# Altium footprint library Package_DFN_QFN.PcbLib: 557 footprints (part 21 of 35) (continued)
## QFN-64-1EP_9x9mm_P0.5mm_EP7.15x7.15mm [mm]
pads (90):
  rrect25% 0.875x0.25 smd: 1(-4.437,3.75) 2(-4.437,3.25) 3(-4.437,2.75) 4(-4.437,2.25) 5(-4.437,1.75) 6(-4.437,1.25) 7(-4.437,0.75) 8(-4.437,0.25) 9(-4.437,-0.25) 10(-4.437,-0.75) 11(-4.437,-1.25) 12(-4.437,-1.75) 13(-4.437,-2.25) 14(-4.437,-2.75) 15(-4.437,-3.25) 16(-4.437,-3.75) 33(4.437,-3.75) 34(4.437,-3.25) 35(4.437,-2.75) 36(4.437,-2.25) 37(4.437,-1.75) 38(4.437,-1.25) 39(4.437,-0.75) 40(4.437,-0.25) 41(4.437,0.25) 42(4.437,0.75) 43(4.437,1.25) 44(4.437,1.75) 45(4.437,2.25) 46(4.437,2.75) 47(4.437,3.25) 48(4.437,3.75)
  rrect25% 0.25x0.875 smd: 17(-3.75,-4.437) 18(-3.25,-4.437) 19(-2.75,-4.437) 20(-2.25,-4.437) 21(-1.75,-4.437) 22(-1.25,-4.437) 23(-0.75,-4.437) 24(-0.25,-4.437) 25(0.25,-4.437) 26(0.75,-4.437) 27(1.25,-4.437) 28(1.75,-4.437) 29(2.25,-4.437) 30(2.75,-4.437) 31(3.25,-4.437) 32(3.75,-4.437) 49(3.75,4.437) 50(3.25,4.437) 51(2.75,4.437) 52(2.25,4.437) 53(1.75,4.437) 54(1.25,4.437) 55(0.75,4.437) 56(0.25,4.437) 57(-0.25,4.437) 58(-0.75,4.437) 59(-1.25,4.437) 60(-1.75,4.437) 61(-2.25,4.437) 62(-2.75,4.437) 63(-3.25,4.437) 64(-3.75,4.437)
  rect 7.15x7.15 smd: 65(0,0)
  rrect22% 1.15x1.15 on Top Paste: Un1(-1.43,2.86) Un2(-2.86,2.86) Un3(2.86,-2.86) Un4(0,2.86) Un5(2.86,-1.43) Un6(2.86,2.86) Un7(1.43,0) Un8(0,1.43) Un9(-1.43,1.43) Un10(0,0) Un11(1.43,2.86) Un12(-2.86,-1.43) Un13(-1.43,-2.86) Un14(1.43,-2.86) Un15(2.86,1.43) Un16(-2.86,-2.86) Un17(-1.43,-1.43) Un18(0,-1.43) Un19(-1.43,0) Un20(1.43,-1.43) Un21(-2.86,1.43) Un22(1.43,1.43) Un23(2.86,0) Un24(0,-2.86) Un25(-2.86,0)
F.SilkS:
  lines w0.12: -4.61,-4.135 -4.61,-4.61 -4.135,-4.61 ; -4.61,4.61 -4.135,4.61 ; 4.135,-4.61 4.61,-4.61 4.61,-4.135 ; 4.135,4.61 4.61,4.61 4.61,4.135
F.CrtYd:
  lines w0.05: -5.12,-5.12 -5.12,5.12 5.12,5.12 5.12,-5.12 -5.12,-5.12
F.Fab:
  lines w0.1: -4.5,-4.5 -4.5,3.5 -3.5,4.5 4.5,4.5 4.5,-4.5 -4.5,-4.5
  text "'.Designator'" at -4.047,-0.84 h1

## QFN-64-1EP_9x9mm_P0.5mm_EP7.15x7.15mm_ThermalVias [mm]
pads (127):
  rrect25% 0.875x0.25 smd: 1(-4.437,3.75) 2(-4.437,3.25) 3(-4.437,2.75) 4(-4.437,2.25) 5(-4.437,1.75) 6(-4.437,1.25) 7(-4.437,0.75) 8(-4.437,0.25) 9(-4.437,-0.25) 10(-4.437,-0.75) 11(-4.437,-1.25) 12(-4.437,-1.75) 13(-4.437,-2.25) 14(-4.437,-2.75) 15(-4.437,-3.25) 16(-4.437,-3.75) 33(4.437,-3.75) 34(4.437,-3.25) 35(4.437,-2.75) 36(4.437,-2.25) 37(4.437,-1.75) 38(4.437,-1.25) 39(4.437,-0.75) 40(4.437,-0.25) 41(4.437,0.25) 42(4.437,0.75) 43(4.437,1.25) 44(4.437,1.75) 45(4.437,2.25) 46(4.437,2.75) 47(4.437,3.25) 48(4.437,3.75)
  rrect25% 0.25x0.875 smd: 17(-3.75,-4.437) 18(-3.25,-4.437) 19(-2.75,-4.437) 20(-2.25,-4.437) 21(-1.75,-4.437) 22(-1.25,-4.437) 23(-0.75,-4.437) 24(-0.25,-4.437) 25(0.25,-4.437) 26(0.75,-4.437) 27(1.25,-4.437) 28(1.75,-4.437) 29(2.25,-4.437) 30(2.75,-4.437) 31(3.25,-4.437) 32(3.75,-4.437) 49(3.75,4.437) 50(3.25,4.437) 51(2.75,4.437) 52(2.25,4.437) 53(1.75,4.437) 54(1.25,4.437) 55(0.75,4.437) 56(0.25,4.437) 57(-0.25,4.437) 58(-0.75,4.437) 59(-1.25,4.437) 60(-1.75,4.437) 61(-2.25,4.437) 62(-2.75,4.437) 63(-3.25,4.437) 64(-3.75,4.437)
  round 0.5 hole 0.2: 65(-3.325,-3.325) 65(-3.325,-1.995) 65(-3.325,-0.665) 65(-3.325,0.665) 65(-3.325,1.995) 65(-3.325,3.325) 65(-1.995,-3.325) 65(-1.995,-1.995) 65(-1.995,-0.665) 65(-1.995,0.665) 65(-1.995,1.995) 65(-1.995,3.325) 65(-0.665,-3.325) 65(-0.665,-1.995) 65(-0.665,-0.665) 65(-0.665,0.665) 65(-0.665,1.995) 65(-0.665,3.325) 65(0.665,-3.325) 65(0.665,-1.995) 65(0.665,-0.665) 65(0.665,0.665) 65(0.665,1.995) 65(0.665,3.325) 65(1.995,-3.325) 65(1.995,-1.995) 65(1.995,-0.665) 65(1.995,0.665) 65(1.995,1.995) 65(1.995,3.325) 65(3.325,-3.325) 65(3.325,-1.995) 65(3.325,-0.665) 65(3.325,0.665) 65(3.325,1.995) 65(3.325,3.325)
  rect 7.15x7.15 smd: 65(0,0)
  rect 7.15x7.15 smd far side: 65(0,0)
  rrect22% 1.153x1.153 on Top Paste: Un1(-2.66,0) Un2(2.66,0) Un3(-1.33,-1.33) Un4(2.66,-2.66) Un5(-2.66,2.66) Un6(1.33,2.66) Un7(-1.33,1.33) Un8(-1.33,2.66) Un9(1.33,-2.66) Un10(1.33,0) Un11(2.66,1.33) Un12(0,1.33) Un13(2.66,-1.33) Un14(-2.66,-1.33) Un15(-1.33,-2.66) Un16(-2.66,-2.66) Un17(0,-2.66) Un18(2.66,2.66) Un19(1.33,1.33) Un20(0,2.66) Un21(0,-1.33) Un22(0,0) Un23(-2.66,1.33) Un24(1.33,-1.33) Un25(-1.33,0)
F.SilkS:
  lines w0.12: -4.61,-4.135 -4.61,-4.61 -4.135,-4.61 ; -4.61,4.61 -4.135,4.61 ; 4.135,-4.61 4.61,-4.61 4.61,-4.135 ; 4.135,4.61 4.61,4.61 4.61,4.135
F.CrtYd:
  lines w0.05: -5.12,-5.12 -5.12,5.12 5.12,5.12 5.12,-5.12 -5.12,-5.12
F.Fab:
  lines w0.1: -4.5,-4.5 4.5,-4.5 4.5,4.5 -3.5,4.5 -4.5,3.5 -4.5,-4.5
  text "'.Designator'" at -4.047,-0.84 h1

## QFN-64-1EP_9x9mm_P0.5mm_EP7.25x7.25mm [mm]
pads (90):
  rrect100% 0.8x0.3 smd: 1(-4.5,3.75) 2(-4.5,3.25) 3(-4.5,2.75) 4(-4.5,2.25) 5(-4.5,1.75) 6(-4.5,1.25) 7(-4.5,0.75) 8(-4.5,0.25) 9(-4.5,-0.25) 10(-4.5,-0.75) 11(-4.5,-1.25) 12(-4.5,-1.75) 13(-4.5,-2.25) 14(-4.5,-2.75) 15(-4.5,-3.25) 16(-4.5,-3.75) 33(4.5,-3.75) 34(4.5,-3.25) 35(4.5,-2.75) 36(4.5,-2.25) 37(4.5,-1.75) 38(4.5,-1.25) 39(4.5,-0.75) 40(4.5,-0.25) 41(4.5,0.25) 42(4.5,0.75) 43(4.5,1.25) 44(4.5,1.75) 45(4.5,2.25) 46(4.5,2.75) 47(4.5,3.25) 48(4.5,3.75)
  rrect100% 0.3x0.8 smd: 17(-3.75,-4.5) 18(-3.25,-4.5) 19(-2.75,-4.5) 20(-2.25,-4.5) 21(-1.75,-4.5) 22(-1.25,-4.5) 23(-0.75,-4.5) 24(-0.25,-4.5) 25(0.25,-4.5) 26(0.75,-4.5) 27(1.25,-4.5) 28(1.75,-4.5) 29(2.25,-4.5) 30(2.75,-4.5) 31(3.25,-4.5) 32(3.75,-4.5) 49(3.75,4.5) 50(3.25,4.5) 51(2.75,4.5) 52(2.25,4.5) 53(1.75,4.5) 54(1.25,4.5) 55(0.75,4.5) 56(0.25,4.5) 57(-0.25,4.5) 58(-0.75,4.5) 59(-1.25,4.5) 60(-1.75,4.5) 61(-2.25,4.5) 62(-2.75,4.5) 63(-3.25,4.5) 64(-3.75,4.5)
  rect 7.25x7.25 smd: 65(0,0)
  rect 1.19x1.19 on Top Paste: Un1(1.4,-2.8) Un2(0,2.8) Un3(2.8,1.4) Un4(0,1.4) Un5(-2.8,-2.8) Un6(-1.4,0) Un7(0,-1.4) Un8(-2.8,0) Un9(2.8,0) Un10(0,-2.8) Un11(2.8,2.8) Un12(0,0) Un13(-1.4,2.8) Un14(-1.4,-1.4) Un15(1.4,0) Un16(1.4,2.8) Un17(-2.8,1.4) Un18(2.8,-1.4) Un19(-1.4,1.4) Un20(2.8,-2.8) Un21(-2.8,2.8) Un22(-1.4,-2.8) Un23(-2.8,-1.4) Un24(1.4,-1.4) Un25(1.4,1.4)
F.SilkS:
  lines w0.12: -4.62,-4.2 -4.62,-4.62 -4.2,-4.62 ; -4.62,4.62 -4.2,4.62 ; 4.2,-4.62 4.62,-4.62 4.62,-4.2 ; 4.2,4.62 4.62,4.62 4.62,4.2
F.CrtYd:
  lines w0.05: -5.15,-5.15 5.15,-5.15 5.15,5.15 -5.15,5.15 -5.15,-5.15
F.Fab:
  lines w0.1: -4.5,-4.5 -4.5,3.5 -3.5,4.5 4.5,4.5 4.5,-4.5 -4.5,-4.5
  text "'.Designator'" at -4.047,-0.84 h1

## QFN-64-1EP_9x9mm_P0.5mm_EP7.35x7.35mm [mm]
pads (90):
  rect 0.85x0.3 smd: 1(-4.45,3.75) 2(-4.45,3.25) 3(-4.45,2.75) 4(-4.45,2.25) 5(-4.45,1.75) 6(-4.45,1.25) 7(-4.45,0.75) 8(-4.45,0.25) 9(-4.45,-0.25) 10(-4.45,-0.75) 11(-4.45,-1.25) 12(-4.45,-1.75) 13(-4.45,-2.25) 14(-4.45,-2.75) 15(-4.45,-3.25) 16(-4.45,-3.75) 33(4.45,-3.75) 34(4.45,-3.25) 35(4.45,-2.75) 36(4.45,-2.25) 37(4.45,-1.75) 38(4.45,-1.25) 39(4.45,-0.75) 40(4.45,-0.25) 41(4.45,0.25) 42(4.45,0.75) 43(4.45,1.25) 44(4.45,1.75) 45(4.45,2.25) 46(4.45,2.75) 47(4.45,3.25) 48(4.45,3.75)
  rect 0.3x0.85 smd: 17(-3.75,-4.45) 18(-3.25,-4.45) 19(-2.75,-4.45) 20(-2.25,-4.45) 21(-1.75,-4.45) 22(-1.25,-4.45) 23(-0.75,-4.45) 24(-0.25,-4.45) 25(0.25,-4.45) 26(0.75,-4.45) 27(1.25,-4.45) 28(1.75,-4.45) 29(2.25,-4.45) 30(2.75,-4.45) 31(3.25,-4.45) 32(3.75,-4.45) 49(3.75,4.45) 50(3.25,4.45) 51(2.75,4.45) 52(2.25,4.45) 53(1.75,4.45) 54(1.25,4.45) 55(0.75,4.45) 56(0.25,4.45) 57(-0.25,4.45) 58(-0.75,4.45) 59(-1.25,4.45) 60(-1.75,4.45) 61(-2.25,4.45) 62(-2.75,4.45) 63(-3.25,4.45) 64(-3.75,4.45)
  rect 7.35x7.35 smd: 65(0,0)
  rect 1.19x1.19 on Top Paste: Un1(-1.47,-2.94) Un2(-2.94,1.47) Un3(1.47,2.94) Un4(-2.94,0) Un5(1.47,0) Un6(1.47,-2.94) Un7(2.94,-1.47) Un8(-1.47,0) Un9(-1.47,2.94) Un10(2.94,0) Un11(0,2.94) Un12(-1.47,-1.47) Un13(2.94,1.47) Un14(0,-1.47) Un15(-2.94,-1.47) Un16(1.47,1.47) Un17(2.94,-2.94) Un18(-2.94,-2.94) Un19(2.94,2.94) Un20(0,1.47) Un21(1.47,-1.47) Un22(0,-2.94) Un23(0,0) Un24(-1.47,1.47) Un25(-2.94,2.94)
F.SilkS:
  lines w0.15: -4.7,-4.125 -4.7,-4.7 -4.125,-4.7 ; -4.7,4.7 -4.125,4.7 ; 4.125,-4.7 4.7,-4.7 4.7,-4.125 ; 4.125,4.7 4.7,4.7 4.7,4.125
F.CrtYd:
  lines w0.05: -5.15,-5.15 -5.15,5.15 5.15,5.15 5.15,-5.15 -5.15,-5.15
F.Fab:
  lines w0.15: -4.5,-4.5 -4.5,3.5 -3.5,4.5 4.5,4.5 4.5,-4.5 -4.5,-4.5
  text "'.Designator'" at -4.047,-0.84 h1

## QFN-64-1EP_9x9mm_P0.5mm_EP7.65x7.65mm [mm]
pads (101):
  rrect25% 0.85x0.25 smd: 1(-4.45,3.75) 2(-4.45,3.25) 3(-4.45,2.75) 4(-4.45,2.25) 5(-4.45,1.75) 6(-4.45,1.25) 7(-4.45,0.75) 8(-4.45,0.25) 9(-4.45,-0.25) 10(-4.45,-0.75) 11(-4.45,-1.25) 12(-4.45,-1.75) 13(-4.45,-2.25) 14(-4.45,-2.75) 15(-4.45,-3.25) 16(-4.45,-3.75) 33(4.45,-3.75) 34(4.45,-3.25) 35(4.45,-2.75) 36(4.45,-2.25) 37(4.45,-1.75) 38(4.45,-1.25) 39(4.45,-0.75) 40(4.45,-0.25) 41(4.45,0.25) 42(4.45,0.75) 43(4.45,1.25) 44(4.45,1.75) 45(4.45,2.25) 46(4.45,2.75) 47(4.45,3.25) 48(4.45,3.75)
  rrect25% 0.25x0.85 smd: 17(-3.75,-4.45) 18(-3.25,-4.45) 19(-2.75,-4.45) 20(-2.25,-4.45) 21(-1.75,-4.45) 22(-1.25,-4.45) 23(-0.75,-4.45) 24(-0.25,-4.45) 25(0.25,-4.45) 26(0.75,-4.45) 27(1.25,-4.45) 28(1.75,-4.45) 29(2.25,-4.45) 30(2.75,-4.45) 31(3.25,-4.45) 32(3.75,-4.45) 49(3.75,4.45) 50(3.25,4.45) 51(2.75,4.45) 52(2.25,4.45) 53(1.75,4.45) 54(1.25,4.45) 55(0.75,4.45) 56(0.25,4.45) 57(-0.25,4.45) 58(-0.75,4.45) 59(-1.25,4.45) 60(-1.75,4.45) 61(-2.25,4.45) 62(-2.75,4.45) 63(-3.25,4.45) 64(-3.75,4.45)
  rect 7.65x7.65 smd: 65(0,0)
  rrect24% 1.03x1.03 on Top Paste: Un1(-3.2,-1.92) Un2(-0.64,-0.64) Un3(3.2,-3.2) Un4(-0.64,-1.92) Un5(1.92,-3.2) Un6(3.2,0.64) Un7(1.92,-0.64) Un8(-1.92,-0.64) Un9(1.92,-1.92) Un10(1.92,0.64) Un11(0.64,1.92) Un12(-0.64,-3.2) Un13(1.92,3.2) Un14(3.2,-0.64) Un15(1.92,1.92) Un16(0.64,-1.92) Un17(3.2,3.2) Un18(0.64,0.64) Un19(3.2,-1.92) Un20(-3.2,1.92) Un21(-1.92,1.92) Un22(-3.2,0.64) Un23(-1.92,0.64) Un24(-0.64,0.64) Un25(-1.92,-3.2) Un26(0.64,-0.64) Un27(-3.2,-0.64) Un28(-1.92,-1.92) Un29(-3.2,3.2) Un30(-0.64,3.2) Un31(-3.2,-3.2) Un32(3.2,1.92) Un33(0.64,-3.2) Un34(0.64,3.2) Un35(-1.92,3.2) Un36(-0.64,1.92)
F.SilkS:
  lines w0.12: -4.61,-4.135 -4.61,-4.61 -4.135,-4.61 ; -4.61,4.61 -4.135,4.61 ; 4.135,-4.61 4.61,-4.61 4.61,-4.135 ; 4.135,4.61 4.61,4.61 4.61,4.135
F.CrtYd:
  lines w0.05: -5.12,-5.12 -5.12,5.12 5.12,5.12 5.12,-5.12 -5.12,-5.12
F.Fab:
  lines w0.1: -4.5,-4.5 4.5,-4.5 4.5,4.5 -3.5,4.5 -4.5,3.5 -4.5,-4.5
  text "'.Designator'" at -4.047,-0.84 h1

## QFN-64-1EP_9x9mm_P0.5mm_EP7.65x7.65mm_ThermalVias [mm]
pads (151):
  rrect25% 0.85x0.25 smd: 1(-4.45,3.75) 2(-4.45,3.25) 3(-4.45,2.75) 4(-4.45,2.25) 5(-4.45,1.75) 6(-4.45,1.25) 7(-4.45,0.75) 8(-4.45,0.25) 9(-4.45,-0.25) 10(-4.45,-0.75) 11(-4.45,-1.25) 12(-4.45,-1.75) 13(-4.45,-2.25) 14(-4.45,-2.75) 15(-4.45,-3.25) 16(-4.45,-3.75) 33(4.45,-3.75) 34(4.45,-3.25) 35(4.45,-2.75) 36(4.45,-2.25) 37(4.45,-1.75) 38(4.45,-1.25) 39(4.45,-0.75) 40(4.45,-0.25) 41(4.45,0.25) 42(4.45,0.75) 43(4.45,1.25) 44(4.45,1.75) 45(4.45,2.25) 46(4.45,2.75) 47(4.45,3.25) 48(4.45,3.75)
  rrect25% 0.25x0.85 smd: 17(-3.75,-4.45) 18(-3.25,-4.45) 19(-2.75,-4.45) 20(-2.25,-4.45) 21(-1.75,-4.45) 22(-1.25,-4.45) 23(-0.75,-4.45) 24(-0.25,-4.45) 25(0.25,-4.45) 26(0.75,-4.45) 27(1.25,-4.45) 28(1.75,-4.45) 29(2.25,-4.45) 30(2.75,-4.45) 31(3.25,-4.45) 32(3.75,-4.45) 49(3.75,4.45) 50(3.25,4.45) 51(2.75,4.45) 52(2.25,4.45) 53(1.75,4.45) 54(1.25,4.45) 55(0.75,4.45) 56(0.25,4.45) 57(-0.25,4.45) 58(-0.75,4.45) 59(-1.25,4.45) 60(-1.75,4.45) 61(-2.25,4.45) 62(-2.75,4.45) 63(-3.25,4.45) 64(-3.75,4.45)
  round 0.5 hole 0.2: 65(-3.575,-3.575) 65(-3.575,-2.383) 65(-3.575,-1.192) 65(-3.575,0) 65(-3.575,1.192) 65(-3.575,2.383) 65(-3.575,3.575) 65(-2.383,-3.575) 65(-2.383,-2.383) 65(-2.383,-1.192) 65(-2.383,0) 65(-2.383,1.192) 65(-2.383,2.383) 65(-2.383,3.575) 65(-1.192,-3.575) 65(-1.192,-2.383) 65(-1.192,-1.192) 65(-1.192,0) 65(-1.192,1.192) 65(-1.192,2.383) 65(-1.192,3.575) 65(0,-3.575) 65(0,-2.383) 65(0,-1.192) 65(0,0) 65(0,1.192) 65(0,2.383) 65(0,3.575) 65(1.192,-3.575) 65(1.192,-2.383) 65(1.192,-1.192) 65(1.192,0) 65(1.192,1.192) 65(1.192,2.383) 65(1.192,3.575) 65(2.383,-3.575) 65(2.383,-2.383) 65(2.383,-1.192) 65(2.383,0) 65(2.383,1.192) 65(2.383,2.383) 65(2.383,3.575) 65(3.575,-3.575) 65(3.575,-2.383) 65(3.575,-1.192) 65(3.575,0) 65(3.575,1.192) 65(3.575,2.383) 65(3.575,3.575)
  rect 7.65x7.65 smd far side: 65(0,0)
  rect 7.65x7.65 smd: 65(0,0)
  rrect24% 1.028x1.028 on Top Paste: Un1(1.787,2.979) Un2(0.596,-1.787) Un3(0.596,-2.979) Un4(-0.596,2.979) Un5(1.787,-2.979) Un6(0.596,1.787) Un7(-1.787,-2.979) Un8(-1.787,-1.787) Un9(2.979,-1.787) Un10(-0.596,-2.979) Un11(1.787,1.787) Un12(-0.596,0.596) Un13(2.979,1.787) Un14(2.979,-2.979) Un15(-2.979,2.979) Un16(0.596,2.979) Un17(1.787,0.596) Un18(-1.787,2.979) Un19(2.979,2.979) Un20(0.596,-0.596) Un21(-1.787,-0.596) Un22(-2.979,-2.979) Un23(1.787,-0.596) Un24(-0.596,-0.596) Un25(2.979,-0.596) Un26(-1.787,1.787) Un27(-2.979,-0.596) Un28(0.596,0.596) Un29(2.979,0.596) Un30(-1.787,0.596) Un31(1.787,-1.787) Un32(-2.979,1.787) Un33(-0.596,-1.787) Un34(-0.596,1.787) Un35(-2.979,-1.787) Un36(-2.979,0.596)
F.SilkS:
  lines w0.12: -4.61,-4.135 -4.61,-4.61 -4.135,-4.61 ; -4.61,4.61 -4.135,4.61 ; 4.135,-4.61 4.61,-4.61 4.61,-4.135 ; 4.135,4.61 4.61,4.61 4.61,4.135
F.CrtYd:
  lines w0.05: -5.12,-5.12 -5.12,5.12 5.12,5.12 5.12,-5.12 -5.12,-5.12
F.Fab:
  lines w0.1: -4.5,-4.5 4.5,-4.5 4.5,4.5 -3.5,4.5 -4.5,3.5 -4.5,-4.5
  text "'.Designator'" at -4.047,-0.84 h1

## QFN-68-1EP_8x8mm_P0.4mm_EP5.2x5.2mm [mm]
pads (85):
  rrect25% 0.825x0.2 smd: 1(-3.938,3.2) 2(-3.938,2.8) 3(-3.938,2.4) 4(-3.938,2) 5(-3.938,1.6) 6(-3.938,1.2) 7(-3.938,0.8) 8(-3.938,0.4) 9(-3.938,0) 10(-3.938,-0.4) 11(-3.938,-0.8) 12(-3.938,-1.2) 13(-3.938,-1.6) 14(-3.938,-2) 15(-3.938,-2.4) 16(-3.938,-2.8) 17(-3.938,-3.2) 35(3.938,-3.2) 36(3.938,-2.8) 37(3.938,-2.4) 38(3.938,-2) 39(3.938,-1.6) 40(3.938,-1.2) 41(3.938,-0.8) 42(3.938,-0.4) 43(3.938,0) 44(3.938,0.4) 45(3.938,0.8) 46(3.938,1.2) 47(3.938,1.6) 48(3.938,2) 49(3.938,2.4) 50(3.938,2.8) 51(3.938,3.2)
  rrect25% 0.2x0.825 smd: 18(-3.2,-3.938) 19(-2.8,-3.938) 20(-2.4,-3.938) 21(-2,-3.938) 22(-1.6,-3.938) 23(-1.2,-3.938) 24(-0.8,-3.938) 25(-0.4,-3.938) 26(0,-3.938) 27(0.4,-3.938) 28(0.8,-3.938) 29(1.2,-3.938) 30(1.6,-3.938) 31(2,-3.938) 32(2.4,-3.938) 33(2.8,-3.938) 34(3.2,-3.938) 52(3.2,3.938) 53(2.8,3.938) 54(2.4,3.938) 55(2,3.938) 56(1.6,3.938) 57(1.2,3.938) 58(0.8,3.938) 59(0.4,3.938) 60(0,3.938) 61(-0.4,3.938) 62(-0.8,3.938) 63(-1.2,3.938) 64(-1.6,3.938) 65(-2,3.938) 66(-2.4,3.938) 67(-2.8,3.938) 68(-3.2,3.938)
  rect 5.2x5.2 smd: 69(0,0)
  rrect24% 1.05x1.05 on Top Paste: Un1(1.95,-0.65) Un2(1.95,-1.95) Un3(-0.65,0.65) Un4(-1.95,-1.95) Un5(-1.95,0.65) Un6(-1.95,-0.65) Un7(-0.65,-0.65) Un8(0.65,-1.95) Un9(0.65,1.95) Un10(-0.65,-1.95) Un11(0.65,0.65) Un12(1.95,0.65) Un13(-1.95,1.95) Un14(-0.65,1.95) Un15(0.65,-0.65) Un16(1.95,1.95)
F.SilkS:
  lines w0.12: -4.11,-3.56 -4.11,-4.11 -3.56,-4.11 ; -4.11,4.11 -3.56,4.11 ; 3.56,-4.11 4.11,-4.11 4.11,-3.56 ; 3.56,4.11 4.11,4.11 4.11,3.56
F.CrtYd:
  lines w0.05: -4.6,-4.6 4.6,-4.6 4.6,4.6 -4.6,4.6 -4.6,-4.6
F.Fab:
  lines w0.1: -4,-4 -4,3 -3,4 4,4 4,-4 -4,-4
  text "'.Designator'" at -4.047,-0.84 h1

## QFN-68-1EP_8x8mm_P0.4mm_EP5.2x5.2mm_ThermalVias [mm]
pads (111):
  rrect25% 0.825x0.2 smd: 1(-3.938,3.2) 2(-3.938,2.8) 3(-3.938,2.4) 4(-3.938,2) 5(-3.938,1.6) 6(-3.938,1.2) 7(-3.938,0.8) 8(-3.938,0.4) 9(-3.938,0) 10(-3.938,-0.4) 11(-3.938,-0.8) 12(-3.938,-1.2) 13(-3.938,-1.6) 14(-3.938,-2) 15(-3.938,-2.4) 16(-3.938,-2.8) 17(-3.938,-3.2) 35(3.938,-3.2) 36(3.938,-2.8) 37(3.938,-2.4) 38(3.938,-2) 39(3.938,-1.6) 40(3.938,-1.2) 41(3.938,-0.8) 42(3.938,-0.4) 43(3.938,0) 44(3.938,0.4) 45(3.938,0.8) 46(3.938,1.2) 47(3.938,1.6) 48(3.938,2) 49(3.938,2.4) 50(3.938,2.8) 51(3.938,3.2)
  rrect25% 0.2x0.825 smd: 18(-3.2,-3.938) 19(-2.8,-3.938) 20(-2.4,-3.938) 21(-2,-3.938) 22(-1.6,-3.938) 23(-1.2,-3.938) 24(-0.8,-3.938) 25(-0.4,-3.938) 26(0,-3.938) 27(0.4,-3.938) 28(0.8,-3.938) 29(1.2,-3.938) 30(1.6,-3.938) 31(2,-3.938) 32(2.4,-3.938) 33(2.8,-3.938) 34(3.2,-3.938) 52(3.2,3.938) 53(2.8,3.938) 54(2.4,3.938) 55(2,3.938) 56(1.6,3.938) 57(1.2,3.938) 58(0.8,3.938) 59(0.4,3.938) 60(0,3.938) 61(-0.4,3.938) 62(-0.8,3.938) 63(-1.2,3.938) 64(-1.6,3.938) 65(-2,3.938) 66(-2.4,3.938) 67(-2.8,3.938) 68(-3.2,3.938)
  round 0.5 hole 0.2: 69(-2.35,-2.35) 69(-2.35,-1.175) 69(-2.35,0) 69(-2.35,1.175) 69(-2.35,2.35) 69(-1.175,-2.35) 69(-1.175,-1.175) 69(-1.175,0) 69(-1.175,1.175) 69(-1.175,2.35) 69(0,-2.35) 69(0,-1.175) 69(0,0) 69(0,1.175) 69(0,2.35) 69(1.175,-2.35) 69(1.175,-1.175) 69(1.175,0) 69(1.175,1.175) 69(1.175,2.35) 69(2.35,-2.35) 69(2.35,-1.175) 69(2.35,0) 69(2.35,1.175) 69(2.35,2.35)
  rect 5.2x5.2 smd: 69(0,0)
  rect 5.2x5.2 smd far side: 69(0,0)
  rrect25% 1.007x1.007 on Top Paste: Un1(0.587,0.587) Un2(1.763,-1.763) Un3(-0.587,-1.763) Un4(1.763,-0.587) Un5(-1.763,-1.763) Un6(0.587,-0.587) Un7(-0.587,1.763) Un8(-1.763,0.587) Un9(1.763,1.763) Un10(1.763,0.587) Un11(0.587,1.763) Un12(-1.763,-0.587) Un13(0.587,-1.763) Un14(-0.587,0.587) Un15(-0.587,-0.587) Un16(-1.763,1.763)
F.SilkS:
  lines w0.12: -4.11,-3.56 -4.11,-4.11 -3.56,-4.11 ; -4.11,4.11 -3.56,4.11 ; 3.56,-4.11 4.11,-4.11 4.11,-3.56 ; 3.56,4.11 4.11,4.11 4.11,3.56
F.CrtYd:
  lines w0.05: -4.6,-4.6 4.6,-4.6 4.6,4.6 -4.6,4.6 -4.6,-4.6
F.Fab:
  lines w0.1: -4,-4 4,-4 4,4 -3,4 -4,3 -4,-4
  text "'.Designator'" at -4.047,-0.84 h1

## QFN-68-1EP_8x8mm_P0.4mm_EP6.4x6.4mm [mm]
pads (85):
  rrect25% 0.925x0.25 smd: 1(-3.888,3.2) 2(-3.888,2.8) 3(-3.888,2.4) 4(-3.888,2) 5(-3.888,1.6) 6(-3.888,1.2) 7(-3.888,0.8) 8(-3.888,0.4) 9(-3.888,0) 10(-3.888,-0.4) 11(-3.888,-0.8) 12(-3.888,-1.2) 13(-3.888,-1.6) 14(-3.888,-2) 15(-3.888,-2.4) 16(-3.888,-2.8) 17(-3.888,-3.2) 35(3.888,-3.2) 36(3.888,-2.8) 37(3.888,-2.4) 38(3.888,-2) 39(3.888,-1.6) 40(3.888,-1.2) 41(3.888,-0.8) 42(3.888,-0.4) 43(3.888,0) 44(3.888,0.4) 45(3.888,0.8) 46(3.888,1.2) 47(3.888,1.6) 48(3.888,2) 49(3.888,2.4) 50(3.888,2.8) 51(3.888,3.2)
  rrect25% 0.25x0.925 smd: 18(-3.2,-3.888) 19(-2.8,-3.888) 20(-2.4,-3.888) 21(-2,-3.888) 22(-1.6,-3.888) 23(-1.2,-3.888) 24(-0.8,-3.888) 25(-0.4,-3.888) 26(0,-3.888) 27(0.4,-3.888) 28(0.8,-3.888) 29(1.2,-3.888) 30(1.6,-3.888) 31(2,-3.888) 32(2.4,-3.888) 33(2.8,-3.888) 34(3.2,-3.888) 52(3.2,3.888) 53(2.8,3.888) 54(2.4,3.888) 55(2,3.888) 56(1.6,3.888) 57(1.2,3.888) 58(0.8,3.888) 59(0.4,3.888) 60(0,3.888) 61(-0.4,3.888) 62(-0.8,3.888) 63(-1.2,3.888) 64(-1.6,3.888) 65(-2,3.888) 66(-2.4,3.888) 67(-2.8,3.888) 68(-3.2,3.888)
  rect 6.4x6.4 smd: 69(0,0)
  rrect19% 1.29x1.29 on Top Paste: Un1(-2.4,2.4) Un2(-2.4,0.8) Un3(-2.4,-0.8) Un4(-2.4,-2.4) Un5(-0.8,2.4) Un6(-0.8,0.8) Un7(-0.8,-0.8) Un8(-0.8,-2.4) Un9(0.8,2.4) Un10(0.8,0.8) Un11(0.8,-0.8) Un12(0.8,-2.4) Un13(2.4,2.4) Un14(2.4,0.8) Un15(2.4,-0.8) Un16(2.4,-2.4)
F.SilkS:
  lines w0.12: -4.11,-3.585 -4.11,-4.11 -3.585,-4.11 ; -4.11,4.11 -3.585,4.11 ; 3.585,-4.11 4.11,-4.11 4.11,-3.585 ; 3.585,4.11 4.11,4.11 4.11,3.585
F.CrtYd:
  lines w0.05: -4.6,-4.6 -4.6,4.6 4.6,4.6 4.6,-4.6 -4.6,-4.6
F.Fab:
  lines w0.1: -4,-4 4,-4 4,4 -3,4 -4,3 -4,-4
  text "'.Designator'" at -4.047,-0.84 h1

## QFN-68-1EP_8x8mm_P0.4mm_EP6.4x6.4mm_ThermalVias [mm]
pads (111):
  rrect25% 0.925x0.25 smd: 1(-3.888,3.2) 2(-3.888,2.8) 3(-3.888,2.4) 4(-3.888,2) 5(-3.888,1.6) 6(-3.888,1.2) 7(-3.888,0.8) 8(-3.888,0.4) 9(-3.888,0) 10(-3.888,-0.4) 11(-3.888,-0.8) 12(-3.888,-1.2) 13(-3.888,-1.6) 14(-3.888,-2) 15(-3.888,-2.4) 16(-3.888,-2.8) 17(-3.888,-3.2) 35(3.888,-3.2) 36(3.888,-2.8) 37(3.888,-2.4) 38(3.888,-2) 39(3.888,-1.6) 40(3.888,-1.2) 41(3.888,-0.8) 42(3.888,-0.4) 43(3.888,0) 44(3.888,0.4) 45(3.888,0.8) 46(3.888,1.2) 47(3.888,1.6) 48(3.888,2) 49(3.888,2.4) 50(3.888,2.8) 51(3.888,3.2)
  rrect25% 0.25x0.925 smd: 18(-3.2,-3.888) 19(-2.8,-3.888) 20(-2.4,-3.888) 21(-2,-3.888) 22(-1.6,-3.888) 23(-1.2,-3.888) 24(-0.8,-3.888) 25(-0.4,-3.888) 26(0,-3.888) 27(0.4,-3.888) 28(0.8,-3.888) 29(1.2,-3.888) 30(1.6,-3.888) 31(2,-3.888) 32(2.4,-3.888) 33(2.8,-3.888) 34(3.2,-3.888) 52(3.2,3.888) 53(2.8,3.888) 54(2.4,3.888) 55(2,3.888) 56(1.6,3.888) 57(1.2,3.888) 58(0.8,3.888) 59(0.4,3.888) 60(0,3.888) 61(-0.4,3.888) 62(-0.8,3.888) 63(-1.2,3.888) 64(-1.6,3.888) 65(-2,3.888) 66(-2.4,3.888) 67(-2.8,3.888) 68(-3.2,3.888)
  round 0.5 hole 0.2: 69(-2.95,-2.95) 69(-2.95,-1.475) 69(-2.95,0) 69(-2.95,1.475) 69(-2.95,2.95) 69(-1.475,-2.95) 69(-1.475,-1.475) 69(-1.475,0) 69(-1.475,1.475) 69(-1.475,2.95) 69(0,-2.95) 69(0,-1.475) 69(0,0) 69(0,1.475) 69(0,2.95) 69(1.475,-2.95) 69(1.475,-1.475) 69(1.475,0) 69(1.475,1.475) 69(1.475,2.95) 69(2.95,-2.95) 69(2.95,-1.475) 69(2.95,0) 69(2.95,1.475) 69(2.95,2.95)
  rect 6.4x6.4 smd: 69(0,0)
  rect 6.4x6.4 smd far side: 69(0,0)
  rrect20% 1.239x1.239 on Top Paste: Un1(-2.213,2.213) Un2(-2.213,0.737) Un3(-2.213,-0.737) Un4(-2.213,-2.213) Un5(-0.737,2.213) Un6(-0.737,0.737) Un7(-0.737,-0.737) Un8(-0.737,-2.213) Un9(0.737,2.213) Un10(0.737,0.737) Un11(0.737,-0.737) Un12(0.737,-2.213) Un13(2.213,2.213) Un14(2.213,0.737) Un15(2.213,-0.737) Un16(2.213,-2.213)
F.SilkS:
  lines w0.12: -4.11,-3.585 -4.11,-4.11 -3.585,-4.11 ; -4.11,4.11 -3.585,4.11 ; 3.585,-4.11 4.11,-4.11 4.11,-3.585 ; 3.585,4.11 4.11,4.11 4.11,3.585
F.CrtYd:
  lines w0.05: -4.6,-4.6 -4.6,4.6 4.6,4.6 4.6,-4.6 -4.6,-4.6
F.Fab:
  lines w0.1: -4,-4 4,-4 4,4 -3,4 -4,3 -4,-4
  text "'.Designator'" at -4.047,-0.84 h1

## QFN-72-1EP_10x10mm_P0.5mm_EP6x6mm [mm]
pads (82):
  rrect25% 0.875x0.25 smd: 1(-4.938,4.25) 2(-4.938,3.75) 3(-4.938,3.25) 4(-4.938,2.75) 5(-4.938,2.25) 6(-4.938,1.75) 7(-4.938,1.25) 8(-4.938,0.75) 9(-4.938,0.25) 10(-4.938,-0.25) 11(-4.938,-0.75) 12(-4.938,-1.25) 13(-4.938,-1.75) 14(-4.938,-2.25) 15(-4.938,-2.75) 16(-4.938,-3.25) 17(-4.938,-3.75) 18(-4.938,-4.25) 37(4.938,-4.25) 38(4.938,-3.75) 39(4.938,-3.25) 40(4.938,-2.75) 41(4.938,-2.25) 42(4.938,-1.75) 43(4.938,-1.25) 44(4.938,-0.75) 45(4.938,-0.25) 46(4.938,0.25) 47(4.938,0.75) 48(4.938,1.25) 49(4.938,1.75) 50(4.938,2.25) 51(4.938,2.75) 52(4.938,3.25) 53(4.938,3.75) 54(4.938,4.25)
  rrect25% 0.25x0.875 smd: 19(-4.25,-4.938) 20(-3.75,-4.938) 21(-3.25,-4.938) 22(-2.75,-4.938) 23(-2.25,-4.938) 24(-1.75,-4.938) 25(-1.25,-4.938) 26(-0.75,-4.938) 27(-0.25,-4.938) 28(0.25,-4.938) 29(0.75,-4.938) 30(1.25,-4.938) 31(1.75,-4.938) 32(2.25,-4.938) 33(2.75,-4.938) 34(3.25,-4.938) 35(3.75,-4.938) 36(4.25,-4.938) 55(4.25,4.938) 56(3.75,4.938) 57(3.25,4.938) 58(2.75,4.938) 59(2.25,4.938) 60(1.75,4.938) 61(1.25,4.938) 62(0.75,4.938) 63(0.25,4.938) 64(-0.25,4.938) 65(-0.75,4.938) 66(-1.25,4.938) 67(-1.75,4.938) 68(-2.25,4.938) 69(-2.75,4.938) 70(-3.25,4.938) 71(-3.75,4.938) 72(-4.25,4.938)
  rect 6x6 smd: 73(0,0)
  rrect16% 1.61x1.61 on Top Paste: Un1(2,2) Un2(0,0) Un3(0,2) Un4(-2,2) Un5(-2,-2) Un6(2,-2) Un7(-2,0) Un8(0,-2) Un9(2,0)
F.SilkS:
  lines w0.12: -5.11,-4.635 -5.11,-5.11 -4.635,-5.11 ; -5.11,5.11 -4.635,5.11 ; 4.635,-5.11 5.11,-5.11 5.11,-4.635 ; 4.635,5.11 5.11,5.11 5.11,4.635
F.CrtYd:
  lines w0.05: -5.62,-5.62 5.62,-5.62 5.62,5.62 -5.62,5.62 -5.62,-5.62
F.Fab:
  lines w0.1: -5,-5 5,-5 5,5 -4,5 -5,4 -5,-5
  text "'.Designator'" at -4.047,-0.84 h1